# Altium footprint library SparkFun-Connectors.PCBLIB: 409 footprints (part 2 of 26)
Each footprint in its own frame and in the unit in brackets; x right, y up, seen from the top. Pads: shape width x height; smd on the part's side, far side on the other; paste and mask are expansions set on the pad; w line width, h text height; cw(c..) or ccw(c..) is an arc to the next point about the centre after c.
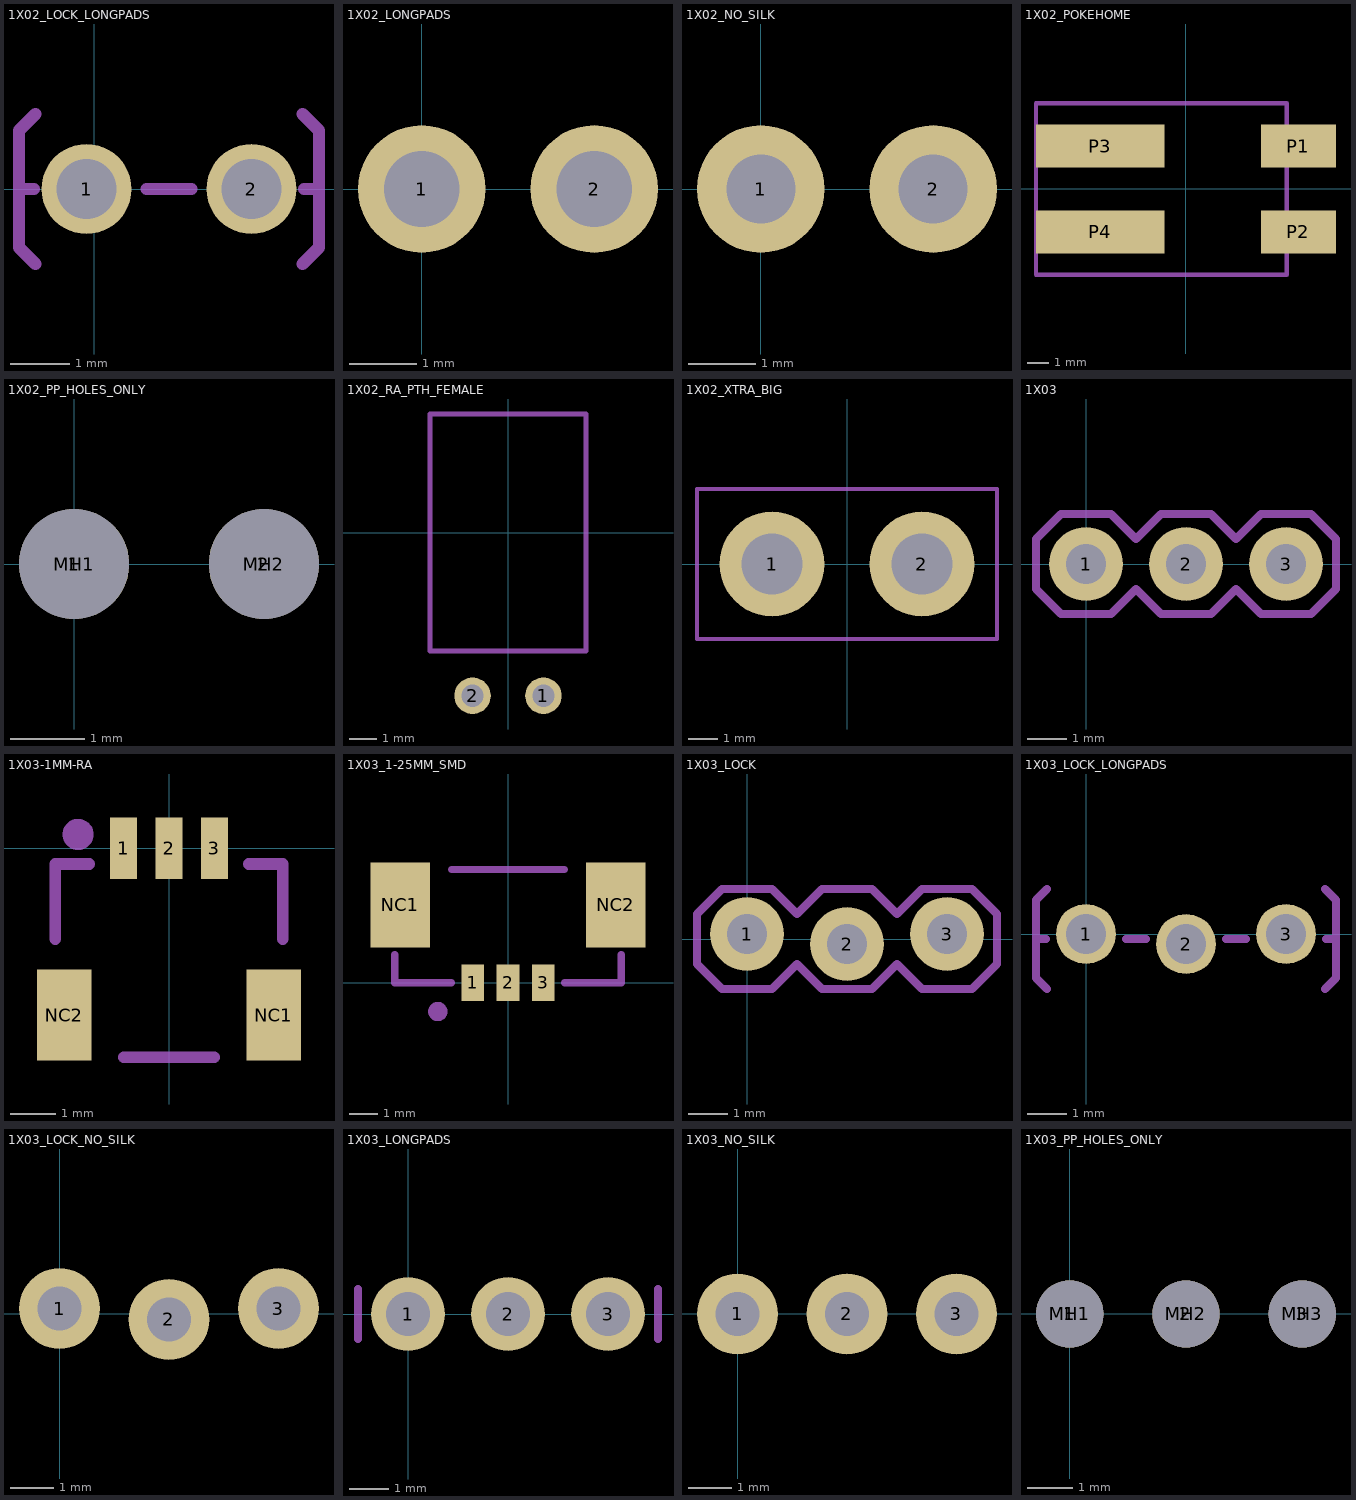
[diagram p1: the footprints below, top view; thin cyan lines are the x and y axes]

## 1X02_LOCK_LONGPADS [mil]
pads (2):
  round 60 hole 40: 1(-5,0) 2(105,0)
tDocu:
  region: -11.5,-11.5 -11.5,11.5 11.5,11.5 11.5,-11.5
  region: 88.5,-11.5 88.5,11.5 111.5,11.5 111.5,-11.5
tPlace:
  lines w8: -40,0 -50,0 ; -39,-50 -50,-39 -50,0 ; -39,50 -50,39 -50,0 ; 35,0 65,0 ; 139,-50 150,-39 150,0 ; 139,50 150,39 150,0 ; 140,0 150,0

## 1X02_LONGPADS [mil]
pads (2):
  round 74 hole 44: 1(0,0) 2(100,0)

## 1X02_NO_SILK [mil]
pads (2):
  round 74 hole 40: 1(0,0) 2(100,0)
tDocu:
  region: 90,-10 90,10 110,10 110,-10
  region: -10,-10 -10,10 10,10 10,-10

## 1X02_POKEHOME [mm]
pads (4):
  rect 3.5x2 smd: P1(5.25,2) P2(5.25,-2)
  rect 6x2 smd: P3(-4,2) P4(-4,-2)
tDocu:
  text "BOARD EDGE" at -7.239,-1.397 h0.47
tPlace:
  lines w0.203: -7,-4 -7,4 4.7,4 4.7,-4 -7,-4

## 1X02_PP_HOLES_ONLY [mil]
pads (4):
  round 35 hole 35: 1(0,0) 2(100,0)
  round 58 hole 58 unplated: MH1(0,0) MH2(100,0)
tDocu:
  circle w5: c0,0 r25
  circle w5: c100,0 r25

## 1X02_RA_PTH_FEMALE [mil]
pads (2):
  round 51.5 hole 31.5: 1(50,-230.32) 2(-50,-230.32)
tPlace:
  lines w7: -109.84,-167.32 -109.84,167.32 109.84,167.32 109.84,-167.32 -109.84,-167.32

## 1X02_XTRA_BIG [mil]
pads (2):
  round 140 hole 81: 1(-100,0) 2(100,0)
tPlace:
  lines w5: -200,-100 -200,100 200,100 200,-100 -200,-100

## 1X03 [mil]
pads (3):
  round 74 hole 40: 1(0,0) 2(100,0) 3(200,0)
tDocu:
  region: 190,-10 190,10 210,10 210,-10
  region: 90,-10 90,10 110,10 110,-10
  region: -10,-10 -10,10 10,10 10,-10
tPlace:
  lines w8: -50,-25 -50,25 -25,50 25,50 50,25 75,50 125,50 150,25 175,50 225,50 250,25 250,-25 225,-50 175,-50 150,-25 125,-50 75,-50 50,-25 25,-50 -25,-50 -50,-25

## 1X03-1MM-RA [mm]
pads (5):
  rect 0.6x1.35 smd: 1(-1,0) 2(0,0) 3(1,0)
  rect 1.2x2 smd: NC1(2.3,-3.675) NC2(-2.3,-3.675)
tPlace:
  circle w0.4: c-2,0.3 r0.141
  lines w0.254: -2.5,-2 -2.5,-0.35 -1.75,-0.35 ; -1,-4.6 1,-4.6 ; 1.75,-0.35 2.5,-0.35 2.5,-2

## 1X03_1-25MM_SMD [mil]
pads (5):
  rect 31.5x51.18 smd: 1(-49.21,0) 2(0,0) 3(49.21,0)
  rect 82.68x118.11 smd: NC1(-149.61,108.27) NC2(149.61,108.27)
tPlace:
  circle w15.75: c-97.64,-40.16 r5.57
  lines w10: -157.48,39.37 -157.48,0 -78.74,0 ; -78.74,157.48 78.74,157.48 ; 78.74,0 157.48,0 157.48,39.37

## 1X03_LOCK [mil]
pads (3):
  round 74 hole 40: 1(0,5) 2(100,-5) 3(200,5)
tDocu:
  region: 190,-10 190,10 210,10 210,-10
  region: 90,-10 90,10 110,10 110,-10
  region: -10,-10 -10,10 10,10 10,-10
tPlace:
  lines w8: -50,-25 -50,25 -25,50 25,50 50,25 75,50 125,50 150,25 175,50 225,50 250,25 250,-25 225,-50 175,-50 150,-25 125,-50 75,-50 50,-25 25,-50 -25,-50 -50,-25

## 1X03_LOCK_LONGPADS [mil]
pads (3):
  round 60 hole 40: 1(0,0) 2(100,-10) 3(200,0)
tDocu:
  region: -11.5,-16.5 -11.5,6.5 11.5,6.5 11.5,-16.5
  region: 88.5,-16.5 88.5,6.5 111.5,6.5 111.5,-16.5
  region: 188.5,-16.5 188.5,6.5 211.5,6.5 211.5,-16.5
tPlace:
  lines w8: -40,-5 -50,-5 ; -39,-55 -50,-44 -50,-5 ; -39,45 -50,34 -50,-5 ; 40,-5 60,-5 ; 140,-5 160,-5 ; 239,-55 250,-44 250,-5 ; 239,45 250,34 250,-5 ; 240,-5 250,-5

## 1X03_LOCK_NO_SILK [mil]
pads (3):
  round 74 hole 40: 1(0,5) 2(100,-5) 3(200,5)
tDocu:
  region: 190,-10 190,10 210,10 210,-10
  region: 90,-10 90,10 110,10 110,-10
  region: -10,-10 -10,10 10,10 10,-10

## 1X03_LONGPADS [mil]
pads (3):
  round 74 hole 44: 1(0,0) 2(100,0) 3(200,0)
tDocu:
  region: 190,-10 190,10 210,10 210,-10
  region: 90,-10 90,10 110,10 110,-10
  region: -10,-10 -10,10 10,10 10,-10
tPlace:
  lines w8: -50,-25 -50,25 ; 250,-25 250,25

## 1X03_NO_SILK [mil]
pads (3):
  round 74 hole 40: 1(0,0) 2(100,0) 3(200,0)
tDocu:
  region: 190,-10 190,10 210,10 210,-10
  region: 90,-10 90,10 110,10 110,-10
  region: -10,-10 -10,10 10,10 10,-10

## 1X03_PP_HOLES_ONLY [mil]
pads (6):
  round 35.43 hole 35.43: 1(0,0) 2(100,0) 3(200,0)
  round 58 hole 58 unplated: MH1(0,0) MH2(100,0) MH3(200,0)
tDocu:
  circle w5: c0,0 r25
  circle w5: c100,0 r25
  circle w5: c200,0 r25